# Altium footprint library TC_otii_stlink.PcbLib: 17 footprints (part 2 of 2)
Each footprint in its own frame and in the unit in brackets; x right, y up, seen from the top. Pads: shape width x height; smd on the part's side, far side on the other; paste and mask are expansions set on the pad; w line width, h text height; cw(c..) or ccw(c..) is an arc to the next point about the centre after c.
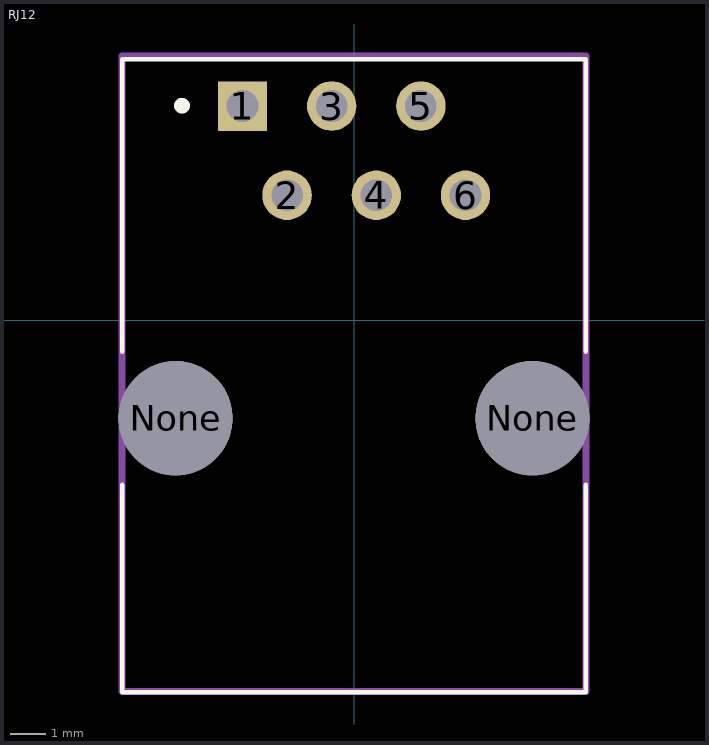
[diagram p1: the footprint, top view; thin cyan lines are the x and y axes]

## RJ12 [mm]
pads (8):
  rect 1.408x1.408 hole 0.9: 1(-3.175,6.096)
  round 1.408 hole 0.9: 2(-1.905,3.556) 3(-0.635,6.096) 4(0.635,3.556) 5(1.905,6.096) 6(3.175,3.556)
  round 3.25 hole 3.25 unplated: None(-5.08,-2.794) None(5.08,-2.794)
Top Overlay:
  circle w0.25: c-4.9,6.106 r0.1
  lines w0.127: -6.605,-4.694 -6.605,-10.594 6.605,-10.594 6.605,-4.694 ; -6.605,-0.894 -6.605,7.426 6.605,7.426 6.605,-0.894
Mechanical 1:
  lines w0.2: -6.606,-10.574 -6.606,7.526 6.604,7.526 6.604,-10.574 -6.606,-10.574
  text "'.Designator'" at -0.508,5.715 h1.3
3D body "955012661.stp": height 11.75, standoff -3.05, extent -6.606,-10.574 6.604,7.526